# Altium footprint library mobinbyn-Header.PcbLib: 297 footprints (part 4 of 23)
Each footprint in its own frame and in the unit in brackets; x right, y up, seen from the top. Pads: shape width x height; smd on the part's side, far side on the other; paste and mask are expansions set on the pad; w line width, h text height; cw(c..) or ccw(c..) is an arc to the next point about the centre after c.
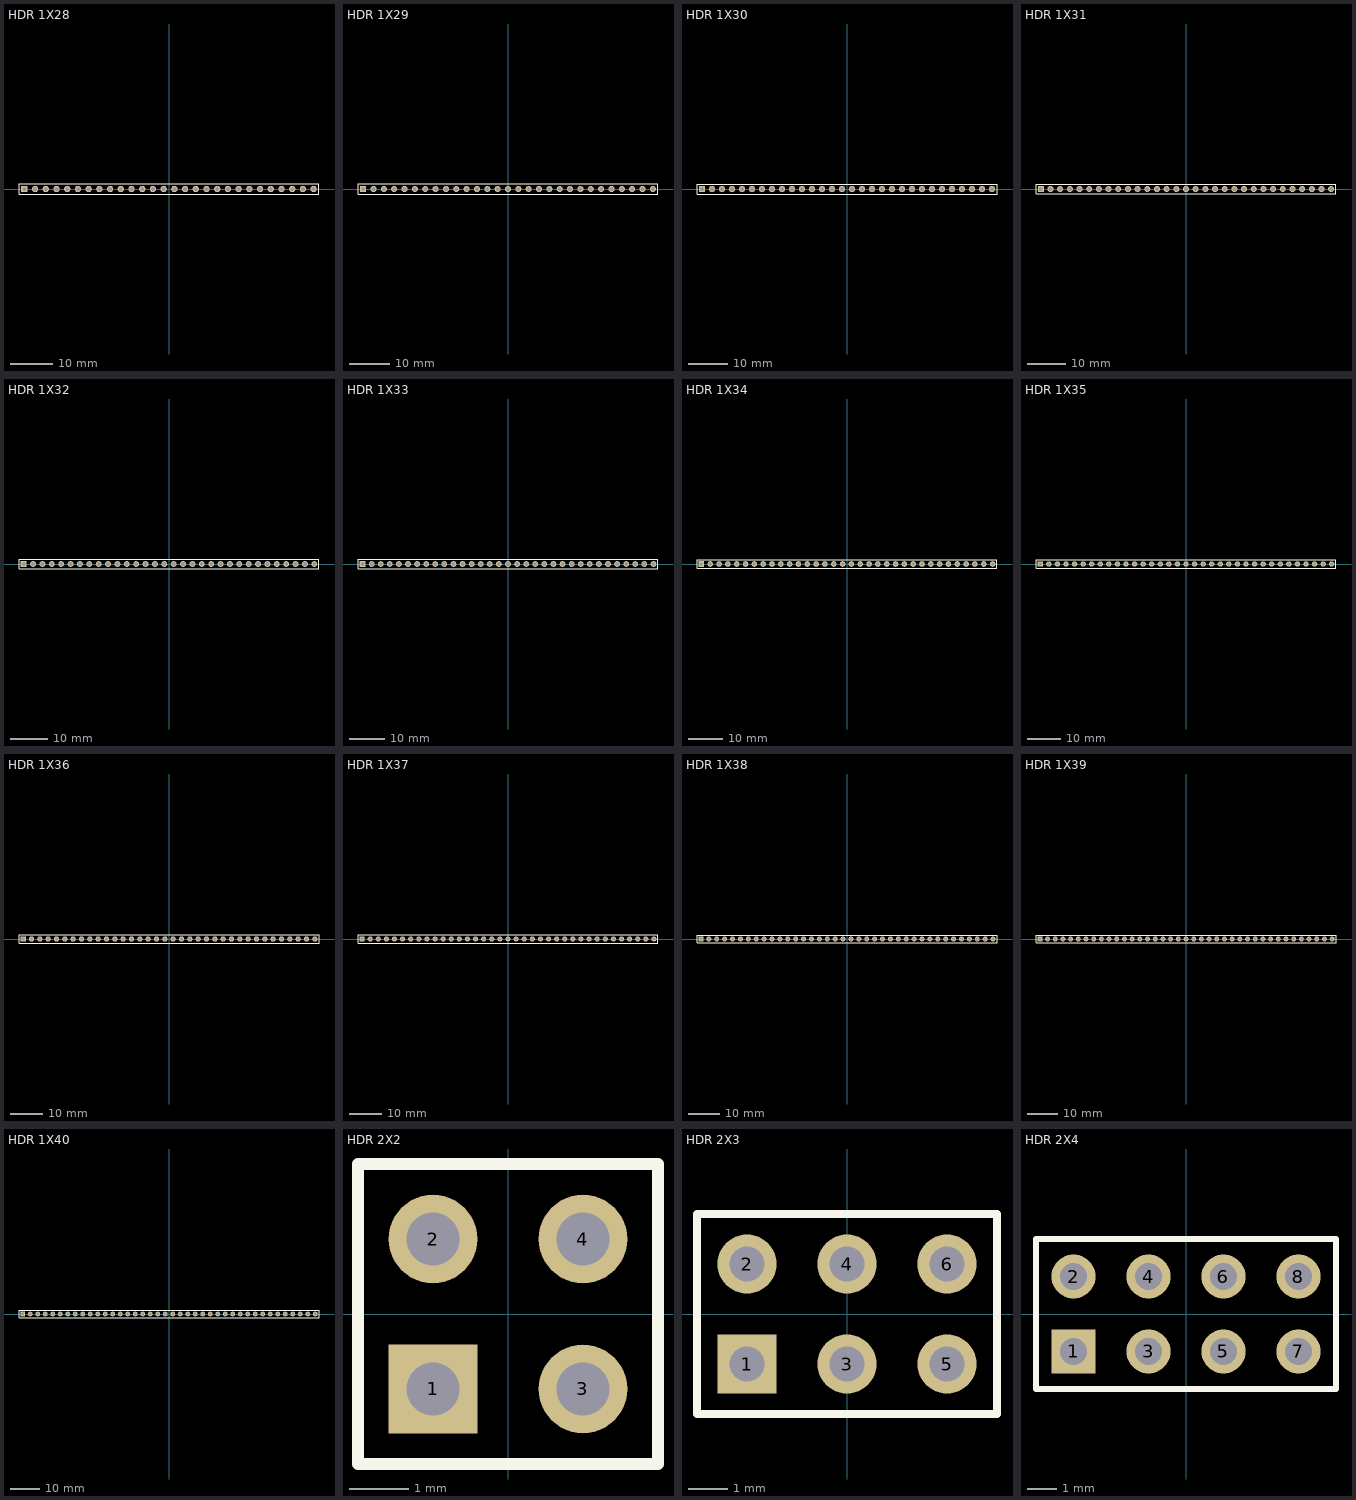
[diagram p3: the footprints below, top view; thin cyan lines are the x and y axes]

## HDR 1X28 [mm] "Connector; Header; 28 Position"
height 1.75
pads (28):
  rect 1.5x1.5 hole 0.9: 1(-34.29,0)
  round 1.5 hole 0.9: 2(-31.75,0) 3(-29.21,0) 4(-26.67,0) 5(-24.13,0) 6(-21.59,0) 7(-19.05,0) 8(-16.51,0) 9(-13.97,0) 10(-11.43,0) 11(-8.89,0) 12(-6.35,0) 13(-3.81,0) 14(-1.27,0) 15(1.27,0) 16(3.81,0) 17(6.35,0) 18(8.89,0) 19(11.43,0) 20(13.97,0) 21(16.51,0) 22(19.05,0) 23(21.59,0) 24(24.13,0) 25(26.67,0) 26(29.21,0) 27(31.75,0) 28(34.29,0)
Top Overlay:
  lines w0.2: -35.56,-1.27 -35.56,1.27 35.56,1.27 35.56,-1.27 -35.56,-1.27
3D body "header 28.STEP": height 8.51, standoff -3.68, extent -35.55,-1.27 35.56,1.26

## HDR 1X29 [mm] "Connector; Header; 29 Position"
height 1.75
pads (29):
  rect 1.5x1.5 hole 0.9: 1(-35.56,0)
  round 1.5 hole 0.9: 2(-33.02,0) 3(-30.48,0) 4(-27.94,0) 5(-25.4,0) 6(-22.86,0) 7(-20.32,0) 8(-17.78,0) 9(-15.24,0) 10(-12.7,0) 11(-10.16,0) 12(-7.62,0) 13(-5.08,0) 14(-2.54,0) 15(0,0) 16(2.54,0) 17(5.08,0) 18(7.62,0) 19(10.16,0) 20(12.7,0) 21(15.24,0) 22(17.78,0) 23(20.32,0) 24(22.86,0) 25(25.4,0) 26(27.94,0) 27(30.48,0) 28(33.02,0) 29(35.56,0)
Top Overlay:
  lines w0.2: -36.83,-1.27 -36.83,1.27 36.83,1.27 36.83,-1.27 -36.83,-1.27
3D body "header 29.STEP": height 8.51, standoff -3.68, extent -36.82,-1.27 36.83,1.26

## HDR 1X30 [mm] "Connector; Header; 30 Position"
height 1.75
pads (30):
  rect 1.6x1.6 hole 0.99: 1(-36.83,0)
  round 1.6 hole 0.99: 2(-34.29,0) 3(-31.75,0) 4(-29.21,0) 5(-26.67,0) 6(-24.13,0) 7(-21.59,0) 8(-19.05,0) 9(-16.51,0) 10(-13.97,0) 11(-11.43,0) 12(-8.89,0) 13(-6.35,0) 14(-3.81,0) 15(-1.27,0) 16(1.27,0) 17(3.81,0) 18(6.35,0) 19(8.89,0) 20(11.43,0) 21(13.97,0) 22(16.51,0) 23(19.05,0) 24(21.59,0) 25(24.13,0) 26(26.67,0) 27(29.21,0) 28(31.75,0) 29(34.29,0) 30(36.83,0)
Top Overlay:
  lines w0.2: -38.1,-1.27 38.1,-1.27 38.1,1.27 -38.1,1.27 -38.1,-1.27
3D body "header 30.STEP": height 8.51, standoff -3.68, extent -38.09,-1.27 38.1,1.26

## HDR 1X31 [mm] "Connector; Header; 31 Position"
height 1.75
pads (31):
  rect 1.6x1.6 hole 0.99: 1(-38.1,0)
  round 1.6 hole 0.99: 2(-35.56,0) 3(-33.02,0) 4(-30.48,0) 5(-27.94,0) 6(-25.4,0) 7(-22.86,0) 8(-20.32,0) 9(-17.78,0) 10(-15.24,0) 11(-12.7,0) 12(-10.16,0) 13(-7.62,0) 14(-5.08,0) 15(-2.54,0) 16(0,0) 17(2.54,0) 18(5.08,0) 19(7.62,0) 20(10.16,0) 21(12.7,0) 22(15.24,0) 23(17.78,0) 24(20.32,0) 25(22.86,0) 26(25.4,0) 27(27.94,0) 28(30.48,0) 29(33.02,0) 30(35.56,0) 31(38.1,0)
Top Overlay:
  lines w0.2: -39.37,-1.27 39.37,-1.27 39.37,1.27 -39.37,1.27 -39.37,-1.27
3D body "header 31.STEP": height 8.51, standoff -3.68, extent -39.36,-1.27 39.37,1.26

## HDR 1X32 [mm] "Connector; Header; 32 Position"
height 1.75
pads (32):
  rect 1.6x1.6 hole 0.99: 1(-39.37,0)
  round 1.6 hole 0.99: 2(-36.83,0) 3(-34.29,0) 4(-31.75,0) 5(-29.21,0) 6(-26.67,0) 7(-24.13,0) 8(-21.59,0) 9(-19.05,0) 10(-16.51,0) 11(-13.97,0) 12(-11.43,0) 13(-8.89,0) 14(-6.35,0) 15(-3.81,0) 16(-1.27,0) 17(1.27,0) 18(3.81,0) 19(6.35,0) 20(8.89,0) 21(11.43,0) 22(13.97,0) 23(16.51,0) 24(19.05,0) 25(21.59,0) 26(24.13,0) 27(26.67,0) 28(29.21,0) 29(31.75,0) 30(34.29,0) 31(36.83,0) 32(39.37,0)
Top Overlay:
  lines w0.2: -40.64,-1.27 -40.64,1.27 40.64,1.27 40.64,-1.27 -40.64,-1.27
3D body "header 32.STEP": height 8.51, standoff -3.68, extent -40.63,-1.27 40.64,1.26

## HDR 1X33 [mm] "Connector; Header; 33 Position"
height 1.75
pads (33):
  rect 1.6x1.6 hole 0.99: 1(-40.64,0)
  round 1.6 hole 0.99: 2(-38.1,0) 3(-35.56,0) 4(-33.02,0) 5(-30.48,0) 6(-27.94,0) 7(-25.4,0) 8(-22.86,0) 9(-20.32,0) 10(-17.78,0) 11(-15.24,0) 12(-12.7,0) 13(-10.16,0) 14(-7.62,0) 15(-5.08,0) 16(-2.54,0) 17(0,0) 18(2.54,0) 19(5.08,0) 20(7.62,0) 21(10.16,0) 22(12.7,0) 23(15.24,0) 24(17.78,0) 25(20.32,0) 26(22.86,0) 27(25.4,0) 28(27.94,0) 29(30.48,0) 30(33.02,0) 31(35.56,0) 32(38.1,0) 33(40.64,0)
Top Overlay:
  lines w0.2: -41.91,-1.27 -41.91,1.27 41.91,1.27 41.91,-1.27 -41.91,-1.27
3D body "header 33.STEP": height 8.51, standoff -3.68, extent -41.9,-1.27 41.91,1.26

## HDR 1X34 [mm] "Connector; Header; 34 Position"
height 1.75
pads (34):
  rect 1.6x1.6 hole 0.99: 1(-41.91,0)
  round 1.6 hole 0.99: 2(-39.37,0) 3(-36.83,0) 4(-34.29,0) 5(-31.75,0) 6(-29.21,0) 7(-26.67,0) 8(-24.13,0) 9(-21.59,0) 10(-19.05,0) 11(-16.51,0) 12(-13.97,0) 13(-11.43,0) 14(-8.89,0) 15(-6.35,0) 16(-3.81,0) 17(-1.27,0) 18(1.27,0) 19(3.81,0) 20(6.35,0) 21(8.89,0) 22(11.43,0) 23(13.97,0) 24(16.51,0) 25(19.05,0) 26(21.59,0) 27(24.13,0) 28(26.67,0) 29(29.21,0) 30(31.75,0) 31(34.29,0) 32(36.83,0) 33(39.37,0) 34(41.91,0)
Top Overlay:
  lines w0.2: -43.18,-1.27 -43.18,1.27 43.18,1.27 43.18,-1.27 -43.18,-1.27
3D body "header 34.STEP": height 8.51, standoff -3.68, extent -43.17,-1.27 43.18,1.26

## HDR 1X35 [mm] "Connector; Header; 35 Position"
height 1.75
pads (35):
  rect 1.6x1.6 hole 0.99: 1(-43.18,0)
  round 1.6 hole 0.99: 2(-40.64,0) 3(-38.1,0) 4(-35.56,0) 5(-33.02,0) 6(-30.48,0) 7(-27.94,0) 8(-25.4,0) 9(-22.86,0) 10(-20.32,0) 11(-17.78,0) 12(-15.24,0) 13(-12.7,0) 14(-10.16,0) 15(-7.62,0) 16(-5.08,0) 17(-2.54,0) 18(0,0) 19(2.54,0) 20(5.08,0) 21(7.62,0) 22(10.16,0) 23(12.7,0) 24(15.24,0) 25(17.78,0) 26(20.32,0) 27(22.86,0) 28(25.4,0) 29(27.94,0) 30(30.48,0) 31(33.02,0) 32(35.56,0) 33(38.1,0) 34(40.64,0) 35(43.18,0)
Top Overlay:
  lines w0.2: -44.45,-1.27 44.45,-1.27 44.45,1.27 -44.45,1.27 -44.45,-1.27
3D body "header 35.STEP": height 8.51, standoff -3.68, extent -44.44,-1.27 44.45,1.26

## HDR 1X36 [mm] "Connector; Header; 36 Position"
height 1.75
pads (36):
  rect 1.6x1.6 hole 0.99: 1(-44.45,0)
  round 1.6 hole 0.99: 2(-41.91,0) 3(-39.37,0) 4(-36.83,0) 5(-34.29,0) 6(-31.75,0) 7(-29.21,0) 8(-26.67,0) 9(-24.13,0) 10(-21.59,0) 11(-19.05,0) 12(-16.51,0) 13(-13.97,0) 14(-11.43,0) 15(-8.89,0) 16(-6.35,0) 17(-3.81,0) 18(-1.27,0) 19(1.27,0) 20(3.81,0) 21(6.35,0) 22(8.89,0) 23(11.43,0) 24(13.97,0) 25(16.51,0) 26(19.05,0) 27(21.59,0) 28(24.13,0) 29(26.67,0) 30(29.21,0) 31(31.75,0) 32(34.29,0) 33(36.83,0) 34(39.37,0) 35(41.91,0) 36(44.45,0)
Top Overlay:
  lines w0.2: -45.72,-1.27 -45.72,1.27 45.72,1.27 45.72,-1.27 -45.72,-1.27
3D body "header 36.STEP": height 8.51, standoff -3.68, extent -45.71,-1.27 45.72,1.26

## HDR 1X37 [mm] "Connector; Header; 37 Position"
height 1.75
pads (37):
  rect 1.6x1.6 hole 0.99: 1(-45.72,0)
  round 1.6 hole 0.99: 2(-43.18,0) 3(-40.64,0) 4(-38.1,0) 5(-35.56,0) 6(-33.02,0) 7(-30.48,0) 8(-27.94,0) 9(-25.4,0) 10(-22.86,0) 11(-20.32,0) 12(-17.78,0) 13(-15.24,0) 14(-12.7,0) 15(-10.16,0) 16(-7.62,0) 17(-5.08,0) 18(-2.54,0) 19(0,0) 20(2.54,0) 21(5.08,0) 22(7.62,0) 23(10.16,0) 24(12.7,0) 25(15.24,0) 26(17.78,0) 27(20.32,0) 28(22.86,0) 29(25.4,0) 30(27.94,0) 31(30.48,0) 32(33.02,0) 33(35.56,0) 34(38.1,0) 35(40.64,0) 36(43.18,0) 37(45.72,0)
Top Overlay:
  lines w0.2: -46.99,-1.27 -46.99,1.27 46.99,1.27 46.99,-1.27 -46.99,-1.27
3D body "header 37.STEP": height 8.51, standoff -3.68, extent -46.98,-1.27 46.99,1.26

## HDR 1X38 [mm] "Connector; Header; 38 Position"
height 1.75
pads (38):
  rect 1.6x1.6 hole 0.99: 1(-46.99,0)
  round 1.6 hole 0.99: 2(-44.45,0) 3(-41.91,0) 4(-39.37,0) 5(-36.83,0) 6(-34.29,0) 7(-31.75,0) 8(-29.21,0) 9(-26.67,0) 10(-24.13,0) 11(-21.59,0) 12(-19.05,0) 13(-16.51,0) 14(-13.97,0) 15(-11.43,0) 16(-8.89,0) 17(-6.35,0) 18(-3.81,0) 19(-1.27,0) 20(1.27,0) 21(3.81,0) 22(6.35,0) 23(8.89,0) 24(11.43,0) 25(13.97,0) 26(16.51,0) 27(19.05,0) 28(21.59,0) 29(24.13,0) 30(26.67,0) 31(29.21,0) 32(31.75,0) 33(34.29,0) 34(36.83,0) 35(39.37,0) 36(41.91,0) 37(44.45,0) 38(46.99,0)
Top Overlay:
  lines w0.2: -48.26,-1.27 -48.26,1.27 48.26,1.27 48.26,-1.27 -48.26,-1.27
3D body "header 38.STEP": height 8.51, standoff -3.68, extent -48.25,-1.27 48.26,1.26

## HDR 1X39 [mm] "Connector; Header; 39 Position"
height 1.75
pads (39):
  rect 1.6x1.6 hole 0.99: 1(-48.26,0)
  round 1.6 hole 0.99: 2(-45.72,0) 3(-43.18,0) 4(-40.64,0) 5(-38.1,0) 6(-35.56,0) 7(-33.02,0) 8(-30.48,0) 9(-27.94,0) 10(-25.4,0) 11(-22.86,0) 12(-20.32,0) 13(-17.78,0) 14(-15.24,0) 15(-12.7,0) 16(-10.16,0) 17(-7.62,0) 18(-5.08,0) 19(-2.54,0) 20(0,0) 21(2.54,0) 22(5.08,0) 23(7.62,0) 24(10.16,0) 25(12.7,0) 26(15.24,0) 27(17.78,0) 28(20.32,0) 29(22.86,0) 30(25.4,0) 31(27.94,0) 32(30.48,0) 33(33.02,0) 34(35.56,0) 35(38.1,0) 36(40.64,0) 37(43.18,0) 38(45.72,0) 39(48.26,0)
Top Overlay:
  lines w0.2: -49.53,-1.27 -49.53,1.27 49.53,1.27 49.53,-1.27 -49.53,-1.27
3D body "header 39.STEP": height 8.51, standoff -3.68, extent -49.52,-1.27 49.53,1.26

## HDR 1X40 [mm] "Connector; Header; 40 Position"
height 1.75
pads (40):
  rect 1.6x1.6 hole 0.99: 1(-49.53,0)
  round 1.6 hole 0.99: 2(-46.99,0) 3(-44.45,0) 4(-41.91,0) 5(-39.37,0) 6(-36.83,0) 7(-34.29,0) 8(-31.75,0) 9(-29.21,0) 10(-26.67,0) 11(-24.13,0) 12(-21.59,0) 13(-19.05,0) 14(-16.51,0) 15(-13.97,0) 16(-11.43,0) 17(-8.89,0) 18(-6.35,0) 19(-3.81,0) 20(-1.27,0) 21(1.27,0) 22(3.81,0) 23(6.35,0) 24(8.89,0) 25(11.43,0) 26(13.97,0) 27(16.51,0) 28(19.05,0) 29(21.59,0) 30(24.13,0) 31(26.67,0) 32(29.21,0) 33(31.75,0) 34(34.29,0) 35(36.83,0) 36(39.37,0) 37(41.91,0) 38(44.45,0) 39(46.99,0) 40(49.53,0)
Top Overlay:
  lines w0.2: -50.8,-1.27 -50.8,1.27 50.8,1.27 50.8,-1.27 -50.8,-1.27
3D body "header 40.STEP": height 8.51, standoff -3.68, extent -50.79,-1.27 50.8,1.26

## HDR 2X2 [mm] "Connector; Header; 2x2 Position"
height 1.75
pads (4):
  rect 1.5x1.5 hole 0.9: 1(-1.27,-1.27)
  round 1.5 hole 0.9: 2(-1.27,1.27) 3(1.27,-1.27) 4(1.27,1.27)
Top Overlay:
  lines w0.2: -2.54,-2.54 -2.54,2.54 2.54,2.54 2.54,-2.54 -2.54,-2.54
3D body "header 2X2.STEP": height 8.51, standoff -3.68, extent -2.54,-2.54 2.54,2.54

## HDR 2X3 [mm] "Connector; Header; 2x3 Position"
height 1.75
pads (6):
  rect 1.5x1.5 hole 0.9: 1(-2.54,-1.27)
  round 1.5 hole 0.9: 2(-2.54,1.27) 3(0,-1.27) 4(0,1.27) 5(2.54,-1.27) 6(2.54,1.27)
Top Overlay:
  lines w0.2: -3.81,-2.54 -3.81,2.54 3.81,2.54 3.81,-2.54 -3.81,-2.54
3D body "header 2X3.STEP": height 8.51, standoff -3.68, extent -3.81,-2.54 3.81,2.54

## HDR 2X4 [mm] "Connector; Header; 2x4 Position"
height 1.75
pads (8):
  rect 1.5x1.5 hole 0.9: 1(-3.81,-1.27)
  round 1.5 hole 0.9: 2(-3.81,1.27) 3(-1.27,-1.27) 4(-1.27,1.27) 5(1.27,-1.27) 6(1.27,1.27) 7(3.81,-1.27) 8(3.81,1.27)
Top Overlay:
  lines w0.2: -5.08,-2.54 5.08,-2.54 5.08,2.54 -5.08,2.54 -5.08,-2.54
3D body "header 2X4.STEP": height 8.51, standoff -3.68, extent -5.08,-2.54 5.08,2.54